# Altium footprint library LukaLIBRARY.PcbLib: 772 footprints (part 40 of 49)
Each footprint in its own frame and in the unit in brackets; x right, y up, seen from the top. Pads: shape width x height; smd on the part's side, far side on the other; paste and mask are expansions set on the pad; w line width, h text height; cw(c..) or ccw(c..) is an arc to the next point about the centre after c.
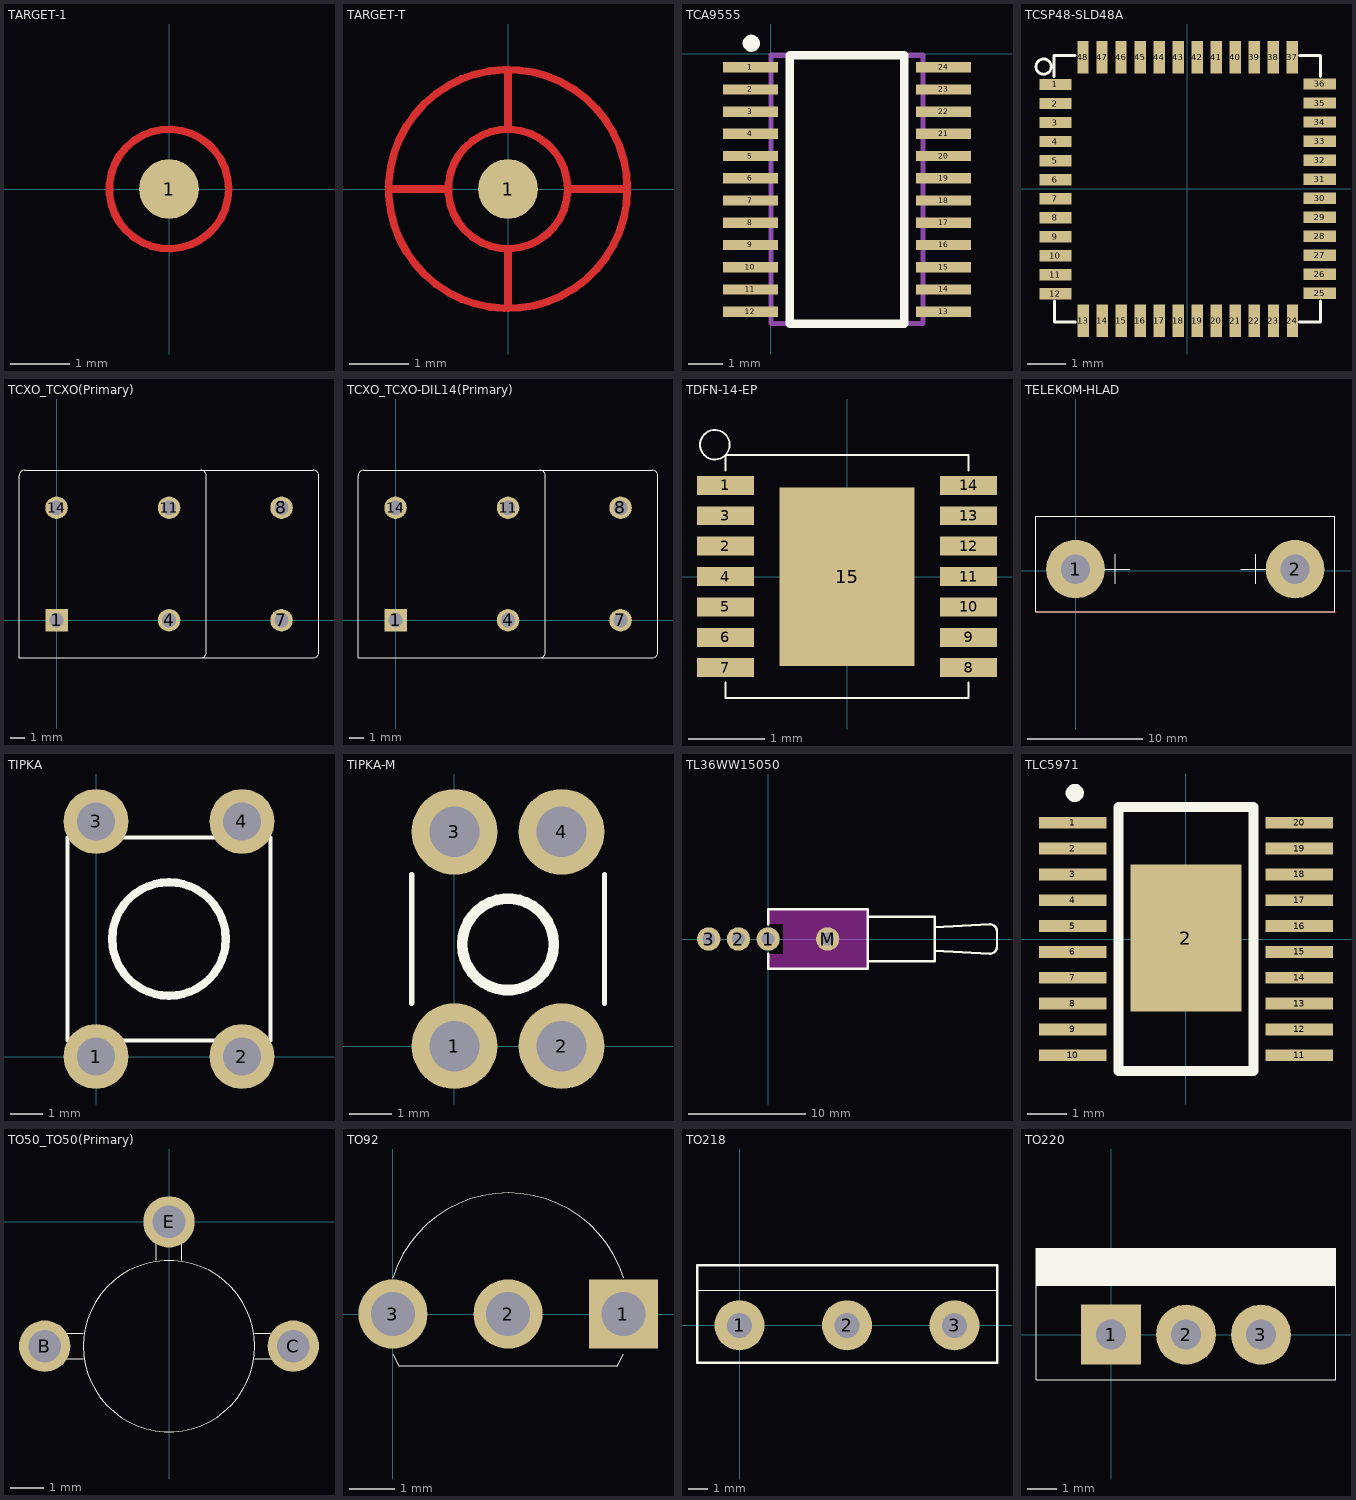
[diagram p39: the footprints below, top view; thin cyan lines are the x and y axes]

## TARGET-1 [mm]
pads (1):
  round 1 smd mask-25.4: 1(0,0)
Top Layer:
  circle w0.127: c0,0 r1
Top Solder:
  region: 0,2.512 -0.49,2.464 -0.961,2.321 -1.396,2.089 -1.776,1.776 -2.089,1.396 -2.321,0.961 -2.464,0.49 -2.512,0 -2.464,-0.49 -2.321,-0.961 -2.089,-1.396 -1.776,-1.776 -1.396,-2.089 -0.961,-2.321 -0.49,-2.464 0,-2.512 0.49,-2.464 0.961,-2.321 1.396,-2.089 1.776,-1.776 2.089,-1.396 2.321,-0.961 2.464,-0.49 2.512,0 2.464,0.49 2.321,0.961 2.089,1.396 1.776,1.776 1.396,2.089 0.961,2.321 0.49,2.464

## TARGET-T [mm]
pads (1):
  round 1 smd mask-25.4: 1(0,0)
Top Layer:
  circle w0.127: c0,0 r1
  circle w0.127: c0,0 r2
  lines w0.127: -2,0 -1,0 ; 0,-2 0,-1 ; 0,1 0,2 ; 1,0 2,0
Top Solder:
  region: 0,2.512 -0.49,2.464 -0.961,2.321 -1.396,2.089 -1.776,1.776 -2.089,1.396 -2.321,0.961 -2.464,0.49 -2.512,0 -2.464,-0.49 -2.321,-0.961 -2.089,-1.396 -1.776,-1.776 -1.396,-2.089 -0.961,-2.321 -0.49,-2.464 0,-2.512 0.49,-2.464 0.961,-2.321 1.396,-2.089 1.776,-1.776 2.089,-1.396 2.321,-0.961 2.464,-0.49 2.512,0 2.464,0.49 2.321,0.961 2.089,1.396 1.776,1.776 1.396,2.089 0.961,2.321 0.49,2.464

## TCA9555 [mm] "I2C I/O Ports PW Package"
pads (24):
  rect 1.6x0.3 smd: 1(-0.6,-0.4) 2(-0.6,-1.05) 3(-0.6,-1.7) 4(-0.6,-2.35) 5(-0.6,-3) 6(-0.6,-3.65) 7(-0.6,-4.3) 8(-0.6,-4.95) 9(-0.6,-5.6) 10(-0.6,-6.25) 11(-0.6,-6.9) 12(-0.6,-7.55) 13(5.05,-7.55) 14(5.05,-6.9) 15(5.05,-6.25) 16(5.05,-5.6) 17(5.05,-4.95) 18(5.05,-4.3) 19(5.05,-3.65) 20(5.05,-3) 21(5.05,-2.35) 22(5.05,-1.7) 23(5.05,-1.05) 24(5.05,-0.4)
Top Overlay:
  circle w0.25: c-0.575,0.3 r0.125
  lines w0.254: 0.55,-7.9 0.55,-0.05 3.9,-0.05 3.9,-7.9 0.55,-7.9
Mechanical 1:
  lines w0.15: 0,-7.9 0,-0.05 4.45,-0.05 4.45,-7.9 0,-7.9

## TCSP48-SLD48A [mm]
pads (48):
  rect 0.85x0.3 smd mask-25.4: 1(-3.471,2.742) 2(-3.471,2.242) 3(-3.471,1.742) 4(-3.471,1.242) 5(-3.471,0.742) 6(-3.471,0.242) 7(-3.471,-0.258) 8(-3.471,-0.758) 9(-3.471,-1.258) 10(-3.471,-1.758) 11(-3.471,-2.258) 12(-3.471,-2.758) 25(3.479,-2.745) 26(3.479,-2.245) 27(3.479,-1.745) 28(3.479,-1.245) 29(3.479,-0.745) 30(3.479,-0.245) 31(3.479,0.255) 32(3.479,0.755) 33(3.479,1.255) 34(3.479,1.755) 35(3.479,2.255) 36(3.479,2.755)
  rect 0.3x0.85 smd mask-25.4: 13(-2.74,-3.472) 14(-2.24,-3.472) 15(-1.74,-3.472) 16(-1.24,-3.472) 17(-0.74,-3.472) 18(-0.24,-3.472) 19(0.26,-3.472) 20(0.76,-3.472) 21(1.26,-3.472) 22(1.76,-3.472) 23(2.26,-3.472) 24(2.76,-3.472) 37(2.753,3.461) 38(2.253,3.461) 39(1.753,3.461) 40(1.253,3.461) 41(0.753,3.461) 42(0.253,3.461) 43(-0.247,3.461) 44(-0.747,3.461) 45(-1.247,3.461) 46(-1.747,3.461) 47(-2.247,3.461) 48(-2.747,3.461)
Top Overlay:
  circle w0.076: c-3.782,3.212 r0.2
  lines w0.076: -3.509,2.95 -3.509,3.5 -2.959,3.5 ; -3.5,-3.5 -2.95,-3.5 ; -3.498,-3.499 -3.498,-2.949 ; 2.948,-3.498 3.498,-3.498 ; 2.948,3.501 3.498,3.501 ; 3.5,-3.498 3.5,-2.948 ; 3.5,2.952 3.5,3.502
Top Solder:
  drawing of 48 lines, arcs and shapes, not listed

## TCXO_TCXO(Primary) [mil]
pads (6):
  rect 60x60 hole 38 mask-1000: 1(0,0)
  round 60 hole 38 mask-1000: 4(300,0) 7(600,0) 8(600,300) 11(300,300) 14(0,300)
Top Overlay:
  lines w1: 385,-100 ccw(c385,-85) 400,-85 400,385 ccw(c385,385) 385,400 ; -100,-100 -100,385 cw(c-85,385) -85,400 685,400 cw(c685,385) 700,385 700,-85 cw(c685,-85) 685,-100 -100,-100
Top Solder:
  region: -30,-30 30,-30 30,30 -30,30
  region: 300,30.26 292.17,29.23 284.87,26.2 278.6,21.4 273.8,15.13 270.77,7.83 269.74,0 270.77,-7.83 273.8,-15.13 278.6,-21.4 284.87,-26.2 292.17,-29.23 300,-30.26 307.83,-29.23 315.13,-26.2 321.4,-21.4 326.2,-15.13 329.23,-7.83 330.26,0 329.23,7.83 326.2,15.13 321.4,21.4 315.13,26.2 307.83,29.23
  region: 300,330.26 292.17,329.23 284.87,326.2 278.6,321.4 273.8,315.13 270.77,307.83 269.74,300 270.77,292.17 273.8,284.87 278.6,278.6 284.87,273.8 292.17,270.77 300,269.74 307.83,270.77 315.13,273.8 321.4,278.6 326.2,284.87 329.23,292.17 330.26,300 329.23,307.83 326.2,315.13 321.4,321.4 315.13,326.2 307.83,329.23
  region: 0,330.26 -7.83,329.23 -15.13,326.2 -21.4,321.4 -26.2,315.13 -29.23,307.83 -30.26,300 -29.23,292.17 -26.2,284.87 -21.4,278.6 -15.13,273.8 -7.83,270.77 0,269.74 7.83,270.77 15.13,273.8 21.4,278.6 26.2,284.87 29.23,292.17 30.26,300 29.23,307.83 26.2,315.13 21.4,321.4 15.13,326.2 7.83,329.23
  region: 600,30.26 592.17,29.23 584.87,26.2 578.6,21.4 573.79,15.13 570.77,7.83 569.74,0 570.77,-7.83 573.79,-15.13 578.6,-21.4 584.87,-26.2 592.17,-29.23 600,-30.26 607.83,-29.23 615.13,-26.2 621.4,-21.4 626.21,-15.13 629.23,-7.83 630.26,0 629.23,7.83 626.21,15.13 621.4,21.4 615.13,26.2 607.83,29.23
  region: 600,330.26 592.17,329.23 584.87,326.2 578.6,321.4 573.79,315.13 570.77,307.83 569.74,300 570.77,292.17 573.79,284.87 578.6,278.6 584.87,273.8 592.17,270.77 600,269.74 607.83,270.77 615.13,273.8 621.4,278.6 626.21,284.87 629.23,292.17 630.26,300 629.23,307.83 626.21,315.13 621.4,321.4 615.13,326.2 607.83,329.23
Bottom Solder:
  region: -30,-30 30,-30 30,30 -30,30
  region: 300,30.26 292.17,29.23 284.87,26.2 278.6,21.4 273.8,15.13 270.77,7.83 269.74,0 270.77,-7.83 273.8,-15.13 278.6,-21.4 284.87,-26.2 292.17,-29.23 300,-30.26 307.83,-29.23 315.13,-26.2 321.4,-21.4 326.2,-15.13 329.23,-7.83 330.26,0 329.23,7.83 326.2,15.13 321.4,21.4 315.13,26.2 307.83,29.23
  region: 300,330.26 292.17,329.23 284.87,326.2 278.6,321.4 273.8,315.13 270.77,307.83 269.74,300 270.77,292.17 273.8,284.87 278.6,278.6 284.87,273.8 292.17,270.77 300,269.74 307.83,270.77 315.13,273.8 321.4,278.6 326.2,284.87 329.23,292.17 330.26,300 329.23,307.83 326.2,315.13 321.4,321.4 315.13,326.2 307.83,329.23
  region: 0,330.26 -7.83,329.23 -15.13,326.2 -21.4,321.4 -26.2,315.13 -29.23,307.83 -30.26,300 -29.23,292.17 -26.2,284.87 -21.4,278.6 -15.13,273.8 -7.83,270.77 0,269.74 7.83,270.77 15.13,273.8 21.4,278.6 26.2,284.87 29.23,292.17 30.26,300 29.23,307.83 26.2,315.13 21.4,321.4 15.13,326.2 7.83,329.23
  region: 600,30.26 592.17,29.23 584.87,26.2 578.6,21.4 573.79,15.13 570.77,7.83 569.74,0 570.77,-7.83 573.79,-15.13 578.6,-21.4 584.87,-26.2 592.17,-29.23 600,-30.26 607.83,-29.23 615.13,-26.2 621.4,-21.4 626.21,-15.13 629.23,-7.83 630.26,0 629.23,7.83 626.21,15.13 621.4,21.4 615.13,26.2 607.83,29.23
  region: 600,330.26 592.17,329.23 584.87,326.2 578.6,321.4 573.79,315.13 570.77,307.83 569.74,300 570.77,292.17 573.79,284.87 578.6,278.6 584.87,273.8 592.17,270.77 600,269.74 607.83,270.77 615.13,273.8 621.4,278.6 626.21,284.87 629.23,292.17 630.26,300 629.23,307.83 626.21,315.13 621.4,321.4 615.13,326.2 607.83,329.23

## TCXO_TCXO-DIL14(Primary) [mil]
pads (6):
  rect 60x60 hole 38 mask-1000: 1(0,0)
  round 60 hole 38 mask-1000: 4(300,0) 7(600,0) 8(600,300) 11(300,300) 14(0,300)
Top Overlay:
  lines w1: 385,-100 ccw(c385,-85) 400,-85 400,385 ccw(c385,385) 385,400 ; -100,-100 685,-100 ccw(c685,-85) 700,-85 700,385 ccw(c685,385) 685,400 -85,400 ccw(c-85,385) -100,385 -100,-100
Top Solder:
  region: 600,330.26 592.17,329.23 584.87,326.2 578.6,321.4 573.79,315.13 570.77,307.83 569.74,300 570.77,292.17 573.79,284.87 578.6,278.6 584.87,273.8 592.17,270.77 600,269.74 607.83,270.77 615.13,273.8 621.4,278.6 626.21,284.87 629.23,292.17 630.26,300 629.23,307.83 626.21,315.13 621.4,321.4 615.13,326.2 607.83,329.23
  region: 600,30.26 592.17,29.23 584.87,26.2 578.6,21.4 573.79,15.13 570.77,7.83 569.74,0 570.77,-7.83 573.79,-15.13 578.6,-21.4 584.87,-26.2 592.17,-29.23 600,-30.26 607.83,-29.23 615.13,-26.2 621.4,-21.4 626.21,-15.13 629.23,-7.83 630.26,0 629.23,7.83 626.21,15.13 621.4,21.4 615.13,26.2 607.83,29.23
  region: 0,330.26 -7.83,329.23 -15.13,326.2 -21.4,321.4 -26.2,315.13 -29.23,307.83 -30.26,300 -29.23,292.17 -26.2,284.87 -21.4,278.6 -15.13,273.8 -7.83,270.77 0,269.74 7.83,270.77 15.13,273.8 21.4,278.6 26.2,284.87 29.23,292.17 30.26,300 29.23,307.83 26.2,315.13 21.4,321.4 15.13,326.2 7.83,329.23
  region: 300,330.26 292.17,329.23 284.87,326.2 278.6,321.4 273.8,315.13 270.77,307.83 269.74,300 270.77,292.17 273.8,284.87 278.6,278.6 284.87,273.8 292.17,270.77 300,269.74 307.83,270.77 315.13,273.8 321.4,278.6 326.2,284.87 329.23,292.17 330.26,300 329.23,307.83 326.2,315.13 321.4,321.4 315.13,326.2 307.83,329.23
  region: 300,30.26 292.17,29.23 284.87,26.2 278.6,21.4 273.8,15.13 270.77,7.83 269.74,0 270.77,-7.83 273.8,-15.13 278.6,-21.4 284.87,-26.2 292.17,-29.23 300,-30.26 307.83,-29.23 315.13,-26.2 321.4,-21.4 326.2,-15.13 329.23,-7.83 330.26,0 329.23,7.83 326.2,15.13 321.4,21.4 315.13,26.2 307.83,29.23
  region: -30,-30 30,-30 30,30 -30,30
Bottom Solder:
  region: 600,330.26 592.17,329.23 584.87,326.2 578.6,321.4 573.79,315.13 570.77,307.83 569.74,300 570.77,292.17 573.79,284.87 578.6,278.6 584.87,273.8 592.17,270.77 600,269.74 607.83,270.77 615.13,273.8 621.4,278.6 626.21,284.87 629.23,292.17 630.26,300 629.23,307.83 626.21,315.13 621.4,321.4 615.13,326.2 607.83,329.23
  region: 600,30.26 592.17,29.23 584.87,26.2 578.6,21.4 573.79,15.13 570.77,7.83 569.74,0 570.77,-7.83 573.79,-15.13 578.6,-21.4 584.87,-26.2 592.17,-29.23 600,-30.26 607.83,-29.23 615.13,-26.2 621.4,-21.4 626.21,-15.13 629.23,-7.83 630.26,0 629.23,7.83 626.21,15.13 621.4,21.4 615.13,26.2 607.83,29.23
  region: 0,330.26 -7.83,329.23 -15.13,326.2 -21.4,321.4 -26.2,315.13 -29.23,307.83 -30.26,300 -29.23,292.17 -26.2,284.87 -21.4,278.6 -15.13,273.8 -7.83,270.77 0,269.74 7.83,270.77 15.13,273.8 21.4,278.6 26.2,284.87 29.23,292.17 30.26,300 29.23,307.83 26.2,315.13 21.4,321.4 15.13,326.2 7.83,329.23
  region: 300,330.26 292.17,329.23 284.87,326.2 278.6,321.4 273.8,315.13 270.77,307.83 269.74,300 270.77,292.17 273.8,284.87 278.6,278.6 284.87,273.8 292.17,270.77 300,269.74 307.83,270.77 315.13,273.8 321.4,278.6 326.2,284.87 329.23,292.17 330.26,300 329.23,307.83 326.2,315.13 321.4,321.4 315.13,326.2 307.83,329.23
  region: 300,30.26 292.17,29.23 284.87,26.2 278.6,21.4 273.8,15.13 270.77,7.83 269.74,0 270.77,-7.83 273.8,-15.13 278.6,-21.4 284.87,-26.2 292.17,-29.23 300,-30.26 307.83,-29.23 315.13,-26.2 321.4,-21.4 326.2,-15.13 329.23,-7.83 330.26,0 329.23,7.83 326.2,15.13 321.4,21.4 315.13,26.2 307.83,29.23
  region: -30,-30 30,-30 30,30 -30,30

## TDFN-14-EP [mm]
pads (15):
  rect 0.75x0.25 smd mask-25.4: 1(-1.6,1.2) 2(-1.6,0.4) 3(-1.6,0.8) 4(-1.6,0) 5(-1.6,-0.4) 6(-1.6,-0.8) 7(-1.6,-1.2) 8(1.6,-1.2) 9(1.6,-0.8) 10(1.6,-0.4) 11(1.6,0) 12(1.6,0.4) 13(1.6,0.8) 14(1.6,1.2)
  rect 1.78x2.35 smd mask-25.4: 15(0,0)
Top Overlay:
  circle w0.025: c-1.74,1.735 r0.194
  lines w0.03: -1.6,-1.4 -1.6,-1.6 1.6,-1.6 1.6,-1.4 ; -1.6,1.4 -1.6,1.6 1.6,1.6 1.6,1.4
Top Solder:
  region: -0.89,-1.175 0.89,-1.175 0.89,1.175 -0.89,1.175
  region: 1.975,-0.1 1.975,0.1 1.225,0.1 1.225,-0.1
  region: -1.225,-0.1 -1.225,0.1 -1.975,0.1 -1.975,-0.1
  region: 1.975,1.1 1.975,1.3 1.225,1.3 1.225,1.1
  region: 1.975,0.7 1.975,0.9 1.225,0.9 1.225,0.7
  region: 1.975,0.3 1.975,0.5 1.225,0.5 1.225,0.3
  region: -1.225,1.1 -1.225,1.3 -1.975,1.3 -1.975,1.1
  region: -1.225,0.7 -1.225,0.9 -1.975,0.9 -1.975,0.7
  region: -1.225,0.3 -1.225,0.5 -1.975,0.5 -1.975,0.3
  region: 1.975,-0.5 1.975,-0.3 1.225,-0.3 1.225,-0.5
  region: 1.975,-0.9 1.975,-0.7 1.225,-0.7 1.225,-0.9
  region: 1.975,-1.3 1.975,-1.1 1.225,-1.1 1.225,-1.3
  region: -1.225,-1.3 -1.225,-1.1 -1.975,-1.1 -1.975,-1.3
  region: -1.975,-0.7 -1.975,-0.9 -1.225,-0.9 -1.225,-0.7
  region: -1.225,-0.5 -1.225,-0.3 -1.975,-0.3 -1.975,-0.5

## TELEKOM-HLAD [mil]
pads (2):
  round 200 hole 100: 1(0,5) 2(750,5)
Top Layer:
  lines w0.39: -135,185 -135,-140 890,-140 ; 885,-140 885,180
Top Overlay:
  lines w3.94: -135,170 -135,185 885,185 885,-140 340,-140 -135,-140 -135,180 ; -50,5 55,5 ; 0,-45 0,55 ; 85,5 185,5 ; 135,-45 135,55 ; 565,5 670,5 ; 615,-45 615,55 ; 700,5 800,5 ; 750,-45 750,55

## TIPKA [mil]
pads (4):
  round 80 hole 47: 1(0,0) 2(180,0) 3(0,290) 4(180,290)
Top Overlay:
  circle w10: c90,145 r70
  lines w5: -35,20 -35,270 ; 30,20 150,20 ; 30,270 150,270 ; 215,20 215,270

## TIPKA-M [mil]
pads (4):
  round 80 hole 47: 1(0,0) 2(100,0) 3(0,200) 4(100,200)
Top Overlay:
  circle w10: c50,95 r42.72
  lines w5: -40,40 -40,160 ; 140,40 140,160

## TL36WW15050 [mm] "Switch; 4 Leads"
pads (4):
  round 2 hole 1.1: 1(0,0) 2(-2.54,0) 3(-5.08,0) M(5.08,0)
Top Layer keep-out:
  region: 1.27,2.54 1.27,-2.54 8.509,-2.54 8.509,2.54
  region: 0,2.54 0,1.27 1.27,1.27 1.27,2.54
  region: 0,-1.27 0,-2.54 1.27,-2.54 1.27,-1.27
Top Overlay:
  lines w0.2: 0,-1.27 0,-2.54 8.509,-2.54 8.509,2.54 0,2.54 0,1.27 ; 8.509,-1.905 14.224,-1.905 14.224,1.905 8.509,1.905 ; 14.224,-1.016 18.923,-1.27 ccw(c18.923,-0.635) 19.558,-0.635 19.558,0.635 ccw(c18.923,0.635) 18.923,1.27 14.224,1.016

## TLC5971 [mm]
pads (21):
  rect 1.7x0.3 smd: 1(-2.85,2.925) 2(-2.85,2.275) 3(-2.85,1.625) 4(-2.85,0.975) 5(-2.85,0.325) 6(-2.85,-0.325) 7(-2.85,-0.975) 8(-2.85,-1.625) 9(-2.85,-2.275) 10(-2.85,-2.925) 11(2.85,-2.925) 12(2.85,-2.275) 13(2.85,-1.625) 14(2.85,-0.975) 15(2.85,-0.325) 16(2.85,0.325) 17(2.85,0.975) 18(2.85,1.625) 19(2.85,2.275) 20(2.85,2.925)
  rect 2.8x3.7 smd: 2(0,0.025)
Top Overlay:
  circle w0.254: c-2.8,3.675 r0.1
  lines w0.254: -1.7,-3.325 -1.7,3.325 1.7,3.325 1.7,-3.325 -1.7,-3.325

## TO50_TO50(Primary) [mil]
pads (3):
  round 60 hole 38: B(-145,-145) C(145,-145) E(0,0)
Top Overlay:
  circle w1: c0,-145 r100
  lines w1: -120,-160 -100,-160 ; -120,-130 -100,-130 ; -15,-45 -15,-25 ; 15,-45 15,-25 ; 100,-160 120,-160 ; 100,-130 120,-130

## TO92 [mil]
pads (3):
  rect 60x60 hole 38 mask-1000: 1(200,0)
  round 60 hole 38 mask-1000: 2(100,0) 3(0,0)
Top Overlay:
  lines w1: -0.14,31.57 cw(c100,0) 200.14,31.57 ; 0,-35 5,-45 195,-45 200,-35
Top Solder:
  region: 0,30.26 -7.83,29.23 -15.13,26.2 -21.4,21.4 -26.2,15.13 -29.23,7.83 -30.26,0 -29.23,-7.83 -26.2,-15.13 -21.4,-21.4 -15.13,-26.2 -7.83,-29.23 0,-30.26 7.83,-29.23 15.13,-26.2 21.4,-21.4 26.2,-15.13 29.23,-7.83 30.26,0 29.23,7.83 26.2,15.13 21.4,21.4 15.13,26.2 7.83,29.23
  region: 170,-30 230,-30 230,30 170,30
  region: 100,30.26 92.17,29.23 84.87,26.2 78.6,21.4 73.8,15.13 70.77,7.83 69.74,0 70.77,-7.83 73.8,-15.13 78.6,-21.4 84.87,-26.2 92.17,-29.23 100,-30.26 107.83,-29.23 115.13,-26.2 121.4,-21.4 126.2,-15.13 129.23,-7.83 130.26,0 129.23,7.83 126.2,15.13 121.4,21.4 115.13,26.2 107.83,29.23
Bottom Solder:
  region: 0,30.26 -7.83,29.23 -15.13,26.2 -21.4,21.4 -26.2,15.13 -29.23,7.83 -30.26,0 -29.23,-7.83 -26.2,-15.13 -21.4,-21.4 -15.13,-26.2 -7.83,-29.23 0,-30.26 7.83,-29.23 15.13,-26.2 21.4,-21.4 26.2,-15.13 29.23,-7.83 30.26,0 29.23,7.83 26.2,15.13 21.4,21.4 15.13,26.2 7.83,29.23
  region: 170,-30 230,-30 230,30 170,30
  region: 100,30.26 92.17,29.23 84.87,26.2 78.6,21.4 73.8,15.13 70.77,7.83 69.74,0 70.77,-7.83 73.8,-15.13 78.6,-21.4 84.87,-26.2 92.17,-29.23 100,-30.26 107.83,-29.23 115.13,-26.2 121.4,-21.4 126.2,-15.13 129.23,-7.83 130.26,0 129.23,7.83 126.2,15.13 121.4,21.4 115.13,26.2 107.83,29.23

## TO218 [mil]
pads (3):
  round 100 hole 50 mask-1000: 1(0,0) 2(215,0) 3(430,0)
Top Overlay:
  lines w1: -85,70 515,70
  lines w5: -85,-75 -85,120 515,120 515,-75 -85,-75
Top Solder:
  region: 0,50.43 -13.05,48.71 -25.22,43.67 -35.66,35.66 -43.67,25.22 -48.71,13.05 -50.43,0 -48.71,-13.05 -43.67,-25.22 -35.66,-35.66 -25.22,-43.67 -13.05,-48.71 0,-50.43 13.05,-48.71 25.22,-43.67 35.66,-35.66 43.67,-25.22 48.71,-13.05 50.43,0 48.71,13.05 43.67,25.22 35.66,35.66 25.22,43.67 13.05,48.71
  region: 215,50.43 201.95,48.71 189.78,43.67 179.34,35.66 171.33,25.22 166.29,13.05 164.57,0 166.29,-13.05 171.33,-25.22 179.34,-35.66 189.78,-43.67 201.95,-48.71 215,-50.43 228.05,-48.71 240.22,-43.67 250.66,-35.66 258.67,-25.22 263.71,-13.05 265.43,0 263.71,13.05 258.67,25.22 250.66,35.66 240.22,43.67 228.05,48.71
  region: 430,50.43 416.95,48.71 404.78,43.67 394.34,35.66 386.33,25.22 381.29,13.05 379.57,0 381.29,-13.05 386.33,-25.22 394.34,-35.66 404.78,-43.67 416.95,-48.71 430,-50.43 443.05,-48.71 455.22,-43.67 465.66,-35.66 473.67,-25.22 478.71,-13.05 480.43,0 478.71,13.05 473.67,25.22 465.66,35.66 455.22,43.67 443.05,48.71
Bottom Solder:
  region: 0,50.43 -13.05,48.71 -25.22,43.67 -35.66,35.66 -43.67,25.22 -48.71,13.05 -50.43,0 -48.71,-13.05 -43.67,-25.22 -35.66,-35.66 -25.22,-43.67 -13.05,-48.71 0,-50.43 13.05,-48.71 25.22,-43.67 35.66,-35.66 43.67,-25.22 48.71,-13.05 50.43,0 48.71,13.05 43.67,25.22 35.66,35.66 25.22,43.67 13.05,48.71
  region: 215,50.43 201.95,48.71 189.78,43.67 179.34,35.66 171.33,25.22 166.29,13.05 164.57,0 166.29,-13.05 171.33,-25.22 179.34,-35.66 189.78,-43.67 201.95,-48.71 215,-50.43 228.05,-48.71 240.22,-43.67 250.66,-35.66 258.67,-25.22 263.71,-13.05 265.43,0 263.71,13.05 258.67,25.22 250.66,35.66 240.22,43.67 228.05,48.71
  region: 430,50.43 416.95,48.71 404.78,43.67 394.34,35.66 386.33,25.22 381.29,13.05 379.57,0 381.29,-13.05 386.33,-25.22 394.34,-35.66 404.78,-43.67 416.95,-48.71 430,-50.43 443.05,-48.71 455.22,-43.67 465.66,-35.66 473.67,-25.22 478.71,-13.05 480.43,0 478.71,13.05 473.67,25.22 465.66,35.66 455.22,43.67 443.05,48.71

## TO220 [mil]
pads (3):
  rect 80x80 hole 40: 1(0,0)
  round 80 hole 40: 2(100,0) 3(200,0)
Top Overlay:
  region: 300,65 300,115 -100,115 -100,65
  lines w1: -100,-60 -100,115 300,115 300,-60 -100,-60